# Altium footprint library MH_DA_THU_VIEN_16122016.PcbLib: 531 footprints (part 1 of 34)
Each footprint in its own frame and in the unit in brackets; x right, y up, seen from the top. Pads: shape width x height; smd on the part's side, far side on the other; paste and mask are expansions set on the pad; w line width, h text height; cw(c..) or ccw(c..) is an arc to the next point about the centre after c.
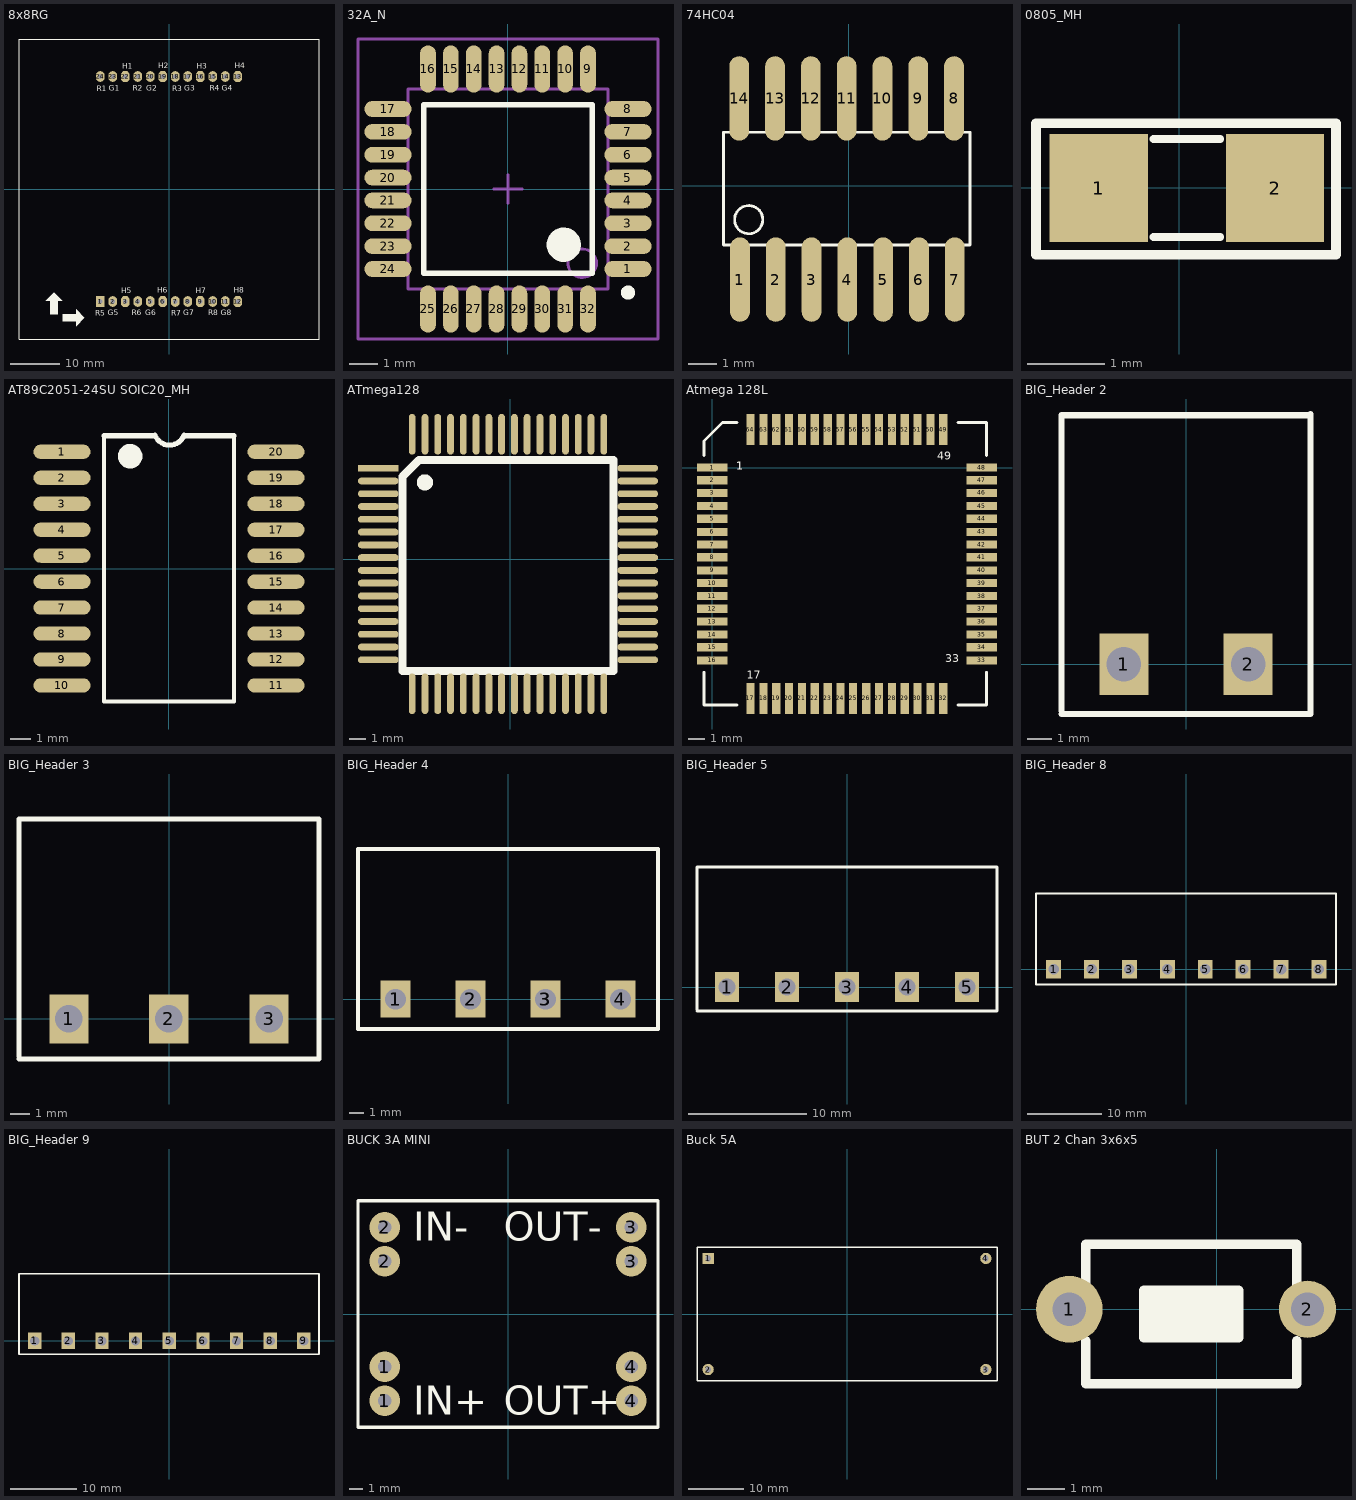
[diagram p0: the footprints below, top view; thin cyan lines are the x and y axes]

## 8x8RG [mil] "Matran 8x8 2mau,Body 60 X 60mm"
height 300
pads (24):
  rect 70x85 hole 37.4: 1(-550,-900)
  oval 70x85 hole 37.4: 2(-450,-900) 4(-250,-900) 5(-150,-900) 7(50,-900) 8(150,-900) 10(350,-900) 11(450,-900) 14(450,900) 15(350,900) 17(150,900) 18(50,900) 20(-150,900) 21(-250,900) 23(-450,900) 24(-550,900)
  oct 70x85 hole 37.4: 3(-350,-900) 6(-50,-900) 9(250,-900) 12(550,-900) 13(550,900) 16(250,900) 19(-50,900) 22(-350,900)
Top Overlay:
  region: -743,-963 -677,-1029 -677,-1031 -742,-1096 -743,-1096 -743,-1059 -849,-1059 -849,-1000 -743,-1000
  region: -987,-895 -921,-829 -919,-829 -854,-894 -854,-895 -891,-895 -891,-1001 -950,-1001 -950,-895
  lines w7: -1200,-1200 -1200,1200 ; -1200,-1200 -1200,1200 ; -1200,-1200 1200,-1200 ; -1200,1200 1200,1200 ; 1200,-1200 1200,1200 ; 1200,-1200 1200,1200
  text "R4" at 324,785 h45
  text "G4" at 420,786 h45
  text "H4" at 526,965 h45
  text "R3" at 26,784 h45
  text "G3" at 122,785 h45
  text "H3" at 223,964 h45
  text "R2" at -292,785 h45
  text "G2" at -184,785 h45
  text "H2" at -86,965 h45
  text "H1" at -376,964 h45
  text "G1" at -482,785 h45
  text "R1" at -578,784 h45
  text "R5" at -590,-1012 h45
  text "G5" at -490,-1011 h45
  text "H5" at -384,-832 h45
  text "H6" at -94,-831 h45
  text "G6" at -192,-1011 h45
  text "R6" at -300,-1011 h45
  text "H7" at 215,-832 h45
  text "G7" at 114,-1011 h45
  text "R7" at 18,-1012 h45
  text "H8" at 518,-831 h45
  text "G8" at 412,-1010 h45
  text "R8" at 313,-1011 h45
Bottom Overlay:
  text "R4" at 393,785 h45
  text "G4" at 489,786 h45
  text "H4" at 595,965 h45
  text "R3" at 95,784 h45
  text "G3" at 191,785 h45
  text "H3" at 292,964 h45
  text "R2" at -223,785 h45
  text "G2" at -115,785 h45
  text "H2" at -17,965 h45
  text "H1" at -307,964 h45
  text "G1" at -413,785 h45
  text "R1" at -509,784 h45
  text "R5" at -521,-1012 h45
  text "G5" at -421,-1011 h45
  text "H5" at -315,-832 h45
  text "H6" at -25,-831 h45
  text "G6" at -123,-1011 h45
  text "R6" at -231,-1011 h45
  text "H7" at 284,-832 h45
  text "G7" at 183,-1011 h45
  text "R7" at 87,-1012 h45
  text "H8" at 587,-831 h45
  text "G8" at 481,-1010 h45
  text "R8" at 382,-1011 h45

## 32A_N [mm]
pads (32):
  oval 1.65x0.55 smd: 1(4.214,-2.794) 2(4.214,-1.994) 3(4.214,-1.194) 4(4.214,-0.394) 5(4.214,0.406) 6(4.214,1.206) 7(4.214,2.006) 8(4.214,2.806) 17(-4.186,2.806) 18(-4.186,2.006) 19(-4.186,1.206) 20(-4.186,0.406) 21(-4.186,-0.394) 22(-4.186,-1.194) 23(-4.186,-1.994) 24(-4.186,-2.794)
  oval 0.55x1.65 smd: 9(2.814,4.206) 10(2.014,4.206) 11(1.214,4.206) 12(0.414,4.206) 13(-0.386,4.206) 14(-1.186,4.206) 15(-1.986,4.206) 16(-2.786,4.206) 25(-2.786,-4.194) 26(-1.986,-4.194) 27(-1.186,-4.194) 28(-0.386,-4.194) 29(0.414,-4.194) 30(1.214,-4.194) 31(2.014,-4.194) 32(2.814,-4.194)
Top Overlay:
  circle w0.25: c4.214,-3.619 r0.125
  circle w0.6: c1.964,-1.944 r0.3
  lines w0.2: -2.936,-2.944 -2.936,2.956 2.964,2.956 2.964,-2.944 -2.936,-2.944
Mechanical 13:
  circle w0.1: c2.614,-2.594 r0.5
  lines w0.1: -3.486,-3.494 -3.486,3.506 3.514,3.506 3.514,-3.494 -3.486,-3.494
Mechanical 15:
  lines w0.1: -0.486,0.006 0.514,0.006 ; 0.014,-0.494 0.014,0.506 ; -5.236,-5.244 -5.236,5.256 5.264,5.256 5.264,-5.244 -5.236,-5.244

## 74HC04 [mm]
pads (14):
  oval 0.7x3 smd: 1(-3.861,-3.327) 2(-2.591,-3.327) 3(-1.321,-3.327) 4(-0.051,-3.327) 5(1.219,-3.327) 6(2.489,-3.327) 7(3.759,-3.327) 8(3.734,3.099) 9(2.464,3.099) 10(1.194,3.099) 11(-0.076,3.099) 12(-1.346,3.099) 13(-2.616,3.099) 14(-3.886,3.099)
Top Layer:
  lines w0.254: -0.076,-3.302 -0.051,-3.327
Top Overlay:
  circle w0.1: c-3.551,-1.202 r0.5
  lines w0.1: -4.451,-2.102 -4.451,1.898 4.299,1.898 4.299,-2.102 -4.451,-2.102
3D body: height 1.1, standoff 0, extent -5.156,-3.744 5.044,3.556

## 0805_MH [mil]
pads (2):
  rect 50x55 smd: 1(-41.04,-0.23) 2(48.96,-0.23)
Top Overlay:
  lines w4: -13.04,-25.23 20.96,-25.23 ; -13.04,24.77 20.96,24.77
  lines w5: -73.04,-34.23 -73.04,32.77 79.96,32.77 79.96,-34.23 -73.04,-34.23
3D body: height 24.02, standoff -0.39, extent -35.8,-27.23 43.73,22.77

## AT89C2051-24SU SOIC20_MH [mm]
pads (20):
  oval 2.794x0.7 smd: 1(-5.235,5.715) 2(-5.235,4.445) 3(-5.235,3.175) 4(-5.235,1.905) 5(-5.235,0.635) 6(-5.235,-0.635) 7(-5.235,-1.905) 8(-5.235,-3.175) 9(-5.235,-4.445) 10(-5.235,-5.715) 11(5.235,-5.715) 12(5.235,-4.445) 13(5.235,-3.175) 14(5.235,-1.905) 15(5.235,-0.635) 16(5.235,0.635) 17(5.235,1.905) 18(5.235,3.175) 19(5.235,4.445) 20(5.235,5.715)
Top Overlay:
  circle w0.6: c-1.9,5.5 r0.3
  lines w0.2: -3.175,6.5 -3.175,-6.5 3.175,-6.5 3.175,6.5
  lines w0.254: -3.175,6.5 -0.785,6.5 ; -0.692,6.535 ccw(c0.022,6.802) 0.73,6.522 ; 0.785,6.5 3.175,6.5
3D body: height 2.57, standoff -0.08, extent -5.391,-6.477 5.239,6.523

## ATmega128 [mm] "Atmega128"
pads (64):
  rect 2.54x0.432 smd: 1(-8.255,5.715)
  oval 2.54x0.432 smd: 2(-8.255,4.915) 3(-8.255,4.115) 4(-8.255,3.315) 5(-8.255,2.515) 6(-8.255,1.715) 7(-8.255,0.915) 8(-8.255,0.115) 9(-8.255,-0.685) 10(-8.255,-1.485) 11(-8.255,-2.285) 12(-8.255,-3.085) 13(-8.255,-3.885) 14(-8.255,-4.685) 15(-8.255,-5.485) 16(-8.255,-6.285) 33(7.995,-6.285) 34(7.995,-5.485) 35(7.995,-4.685) 36(7.995,-3.885) 37(7.995,-3.085) 38(7.995,-2.285) 39(7.995,-1.485) 40(7.995,-0.685) 41(7.995,0.115) 42(7.995,0.915) 43(7.995,1.715) 44(7.995,2.515) 45(7.995,3.315) 46(7.995,4.115) 47(7.995,4.915) 48(7.995,5.715)
  oval 0.432x2.54 smd: 17(-6.13,-8.41) 18(-5.33,-8.41) 19(-4.53,-8.41) 20(-3.73,-8.41) 21(-2.93,-8.41) 22(-2.13,-8.41) 23(-1.33,-8.41) 24(-0.53,-8.41) 25(0.27,-8.41) 26(1.07,-8.41) 27(1.87,-8.41) 28(2.67,-8.41) 29(3.47,-8.41) 30(4.27,-8.41) 31(5.07,-8.41) 32(5.87,-8.41) 49(5.87,7.84) 50(5.07,7.84) 51(4.27,7.84) 52(3.47,7.84) 53(2.67,7.84) 54(1.87,7.84) 55(1.07,7.84) 56(0.27,7.84) 57(-0.53,7.84) 58(-1.33,7.84) 59(-2.13,7.84) 60(-2.93,7.84) 61(-3.73,7.84) 62(-4.53,7.84) 63(-5.33,7.84) 64(-6.13,7.84)
Top Overlay:
  circle w0.508: c-5.334,4.826 r0.254
  lines w0.508: -6.731,-6.985 6.477,-6.985 6.477,6.223 -5.715,6.223 -6.731,5.207 -6.731,-6.985
3D body: height 1.01, standoff -0.1, extent -8.128,-8.304 7.872,7.696

## Atmega 128L [mil] "Atmega 128L, 64 pin SMT"
height 100
pads (64):
  rect 75x20 smd: 1(0,0) 2(0,-31) 3(0,-62) 4(0,-94) 5(0,-125) 6(0,-157) 7(0,-188) 8(0,-219) 9(0,-251) 10(0,-282) 11(0,-314) 12(0,-345) 13(0,-376) 14(0,-408) 15(0,-439) 16(0,-471) 33(658,-471) 34(658,-439) 35(658,-408) 36(658,-376) 37(658,-345) 38(658,-314) 39(658,-282) 40(658,-251) 41(658,-219) 42(658,-188) 43(658,-157) 44(658,-125) 45(658,-94) 46(658,-62) 47(658,-31) 48(658,0)
  rect 20x75 smd: 17(93,-564) 18(125,-564) 19(156,-564) 20(187,-564) 21(219,-564) 22(250,-564) 23(282,-564) 24(313,-564) 25(344,-564) 26(376,-564) 27(407,-564) 28(439,-564) 29(470,-564) 30(501,-564) 31(533,-564) 32(564,-564) 49(564,93) 50(533,93) 51(501,93) 52(470,93) 53(439,93) 54(407,93) 55(376,93) 56(344,93) 57(313,93) 58(282,93) 59(250,93) 60(219,93) 61(187,93) 62(156,93) 63(125,93) 64(93,93)
Top Overlay:
  lines w7: -20,-500 -20,-580 60,-580 ; -20,30 -20,65 25,110 60,110 ; 600,-580 670,-580 670,-500 ; 600,110 670,110 670,30
  text "1" at 59,-5.5 h20
  text "1" at 59,-5.5 h20
  text "49" at 549,19.5 h20
  text "17" at 84,-515.5 h20
  text "33" at 569,-475.5 h20
3D body: height 39.87, standoff -3.83, extent 15,-549.92 644.92,80

## BIG_Header 2 [mm]
pads (2):
  rect 2x2.5 hole 1.4: 1(-2.54,0) 2(2.54,0)
Top Overlay:
  lines w0.254: -5.08,-2.032 5.08,-2.032 5.08,10.211 ; -5.08,-1.905 -5.08,10.173 ; -5.08,10.16 5.08,10.16
3D body: height 3.15, standoff -9.32, extent -5.04,-1.75 -0.04,10.25
3D body: height 3.15, standoff -9.32, extent 0.04,-1.75 5.04,10.25

## BIG_Header 3 [mm]
pads (3):
  rect 2x2.5 hole 1.4: 1(-5.086,0) 2(-0.006,0) 3(5.086,0)
Top Overlay:
  lines w0.254: -7.626,-2.032 7.626,-2.032 7.626,10.16 -7.626,10.16 -7.626,-1.905
3D body: height 3.15, standoff -9.32, extent -7.586,-1.75 -2.586,10.25
3D body: height 3.15, standoff -9.32, extent -2.494,-1.75 2.506,10.25
3D body: height 3.15, standoff -9.32, extent 2.586,-1.75 7.586,10.25

## BIG_Header 4 [mm]
pads (7):
  rect 2x2.5 hole 1.4: 1(-7.62,0) 1(-7.62,0) 2(-2.54,0) 2(-2.54,0) 3(2.54,0) 3(2.553,0) 4(7.62,0)
Top Overlay:
  lines w0.254: 5.093,-2.032 -10.16,-2.032 0,-2.032 10.16,-2.032 10.16,10.173 -10.147,10.173 -10.16,10.173 -10.16,-1.905 -10.16,10.16 ; 5.093,10.16 -10.16,10.16 ; 10.16,10.16 -10.16,10.16
3D body: height 3.15, standoff -9.32, extent -10.12,-1.75 -5.12,10.25
3D body: height 3.15, standoff -9.32, extent -5.04,-1.75 -0.04,10.25
3D body: height 3.15, standoff -9.32, extent 0.04,-1.75 5.04,10.25
3D body: height 3.15, standoff -9.32, extent 5.12,-1.75 10.12,10.25

## BIG_Header 5 [mm]
pads (5):
  rect 2x2.5 hole 1.4: 1(-10.16,0) 2(-5.08,0) 3(0,0) 4(5.08,0) 5(10.16,0)
Top Overlay:
  lines w0.254: -12.7,-2.032 -2.54,-2.032 12.7,-2.032 12.7,10.16 ; -12.7,-1.905 -12.7,10.16 ; -12.7,10.16 12.7,10.16 ; -12.7,10.16 -3.912,10.16 12.7,10.16
3D body: height 3.15, standoff -9.32, extent -12.66,-1.75 -7.66,10.25
3D body: height 3.15, standoff -9.32, extent -7.58,-1.75 -2.58,10.25
3D body: height 3.15, standoff -9.32, extent -2.5,-1.75 2.5,10.25
3D body: height 3.15, standoff -9.32, extent 2.58,-1.75 7.58,10.25
3D body: height 3.15, standoff -9.32, extent 7.66,-1.75 12.66,10.25

## BIG_Header 8 [mm]
pads (8):
  rect 2x2.5 hole 1.4: 1(-17.78,0) 2(-12.7,0) 3(-7.62,0) 4(-2.54,0) 5(2.54,0) 6(7.62,0) 7(12.7,0) 8(17.78,0)
Top Overlay:
  lines w0.254: -3.937,10.16 20.066,10.16 20.066,-2.032 10.16,-2.032 0,-2.032 -10.16,-2.032 -20.142,-2.032 -20.142,10.16 0,10.16
3D body: height 3.15, standoff -9.32, extent 15.28,-1.75 20.28,10.25
3D body: height 3.15, standoff -9.32, extent 10.2,-1.75 15.2,10.25
3D body: height 3.15, standoff -9.32, extent 5.12,-1.75 10.12,10.25
3D body: height 3.15, standoff -9.32, extent 0.04,-1.75 5.04,10.25
3D body: height 3.15, standoff -9.32, extent -5.04,-1.75 -0.04,10.25
3D body: height 3.15, standoff -9.32, extent -10.12,-1.75 -5.12,10.25
3D body: height 3.15, standoff -9.32, extent -15.2,-1.75 -10.2,10.25
3D body: height 3.15, standoff -9.32, extent -20.28,-1.75 -15.28,10.25

## BIG_Header 9 [mm]
pads (9):
  rect 2x2.5 hole 1.4: 1(-20.32,0) 2(-15.24,0) 3(-10.16,0) 4(-5.08,0) 5(0,0) 6(5.08,0) 7(10.16,0) 8(15.24,0) 9(20.32,0)
Top Overlay:
  lines w0.254: -6.477,10.16 22.606,10.16 22.606,-2.032 7.62,-2.032 -2.54,-2.032 -12.7,-2.032 -22.682,-2.032 -22.682,10.16 -2.54,10.16
3D body: height 3.15, standoff -9.32, extent 17.82,-1.75 22.82,10.25
3D body: height 3.15, standoff -9.32, extent 12.74,-1.75 17.74,10.25
3D body: height 3.15, standoff -9.32, extent 7.66,-1.75 12.66,10.25
3D body: height 3.15, standoff -9.32, extent 2.58,-1.75 7.58,10.25
3D body: height 3.15, standoff -9.32, extent -2.5,-1.75 2.5,10.25
3D body: height 3.15, standoff -9.32, extent -7.58,-1.75 -2.58,10.25
3D body: height 3.15, standoff -9.32, extent -12.66,-1.75 -7.66,10.25
3D body: height 3.15, standoff -9.32, extent -17.74,-1.75 -12.74,10.25
3D body: height 3.15, standoff -9.32, extent -22.82,-1.75 -17.82,10.25

## BUCK 3A MINI [mil]
pads (8):
  round 90 hole 40: 1(-364.17,-255.91) 1(-364.17,-155.91) 2(-364.17,155.91) 2(-364.17,255.91) 3(364.17,155.91) 3(364.17,255.91) 4(364.17,-255.91) 4(364.17,-155.91)
Top Overlay:
  lines w10: -442.91,-334.65 442.91,-334.65 442.91,334.65 -442.91,334.65 -442.91,-334.65
  text "OUT+" at -12,-298 h85
  text "OUT-" at -12,216 h85
  text "IN-" at -280,216 h85
  text "IN+" at -280,-298 h85

## Buck 5A [mil]
pads (4):
  rect 80x80 hole 40: 1(-984.25,393.7)
  round 80 hole 40: 2(-984.25,-393.7) 3(984.25,-393.7) 4(984.25,393.7)
Top Overlay:
  lines w10: -1062.99,-472.44 1062.99,-472.44 1062.99,472.44 -1062.99,472.44 -1062.99,-472.44

## BUT 2 Chan 3x6x5 [mil]
pads (2):
  round 70 hole 35: 1(-155,0)
  round 60 hole 35: 2(95,0)
Top Overlay:
  rectangle: -77,-30 23,20
  lines w10: -138,-33 -138,-78 84,-78 84,-33 ; -138,23 -138,68 84,68 84,23 ; -77,-30 23,-30 23,20 -77,20 -77,-30
3D body: height 98.43, standoff 0, extent -147.07,-77.83 93.09,67.84